# Altium footprint library MyPcbLib.PcbLib: 65 footprints (part 5 of 5)
Each footprint in its own frame and in the unit in brackets; x right, y up, seen from the top. Pads: shape width x height; smd on the part's side, far side on the other; paste and mask are expansions set on the pad; w line width, h text height; cw(c..) or ccw(c..) is an arc to the next point about the centre after c.
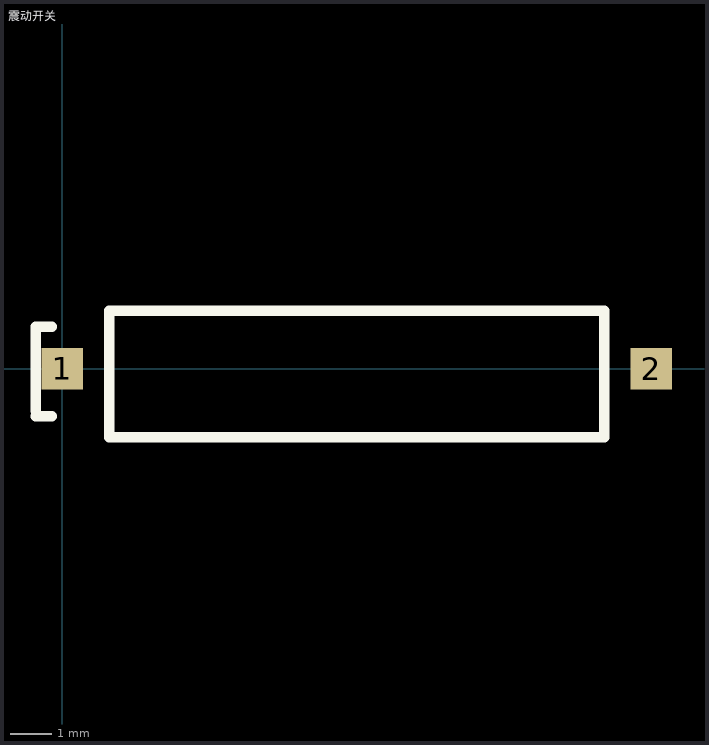
[diagram p4: the footprint, top view; thin cyan lines are the x and y axes]

## 震动开关 [mm]
pads (2):
  rect 1x1 smd: 1(0,0) 2(14.224,0)
Top Overlay:
  lines w0.254: -0.635,-1.143 -0.254,-1.143 ; -0.635,-1.016 -0.635,1.016 -0.254,1.016 ; 1.143,-1.651 1.143,1.397 13.081,1.397 13.081,-1.651 1.143,-1.651